# Altium footprint library lib_datalogger.PcbLib: 866 footprints (part 31 of 55)
Each footprint in its own frame and in the unit in brackets; x right, y up, seen from the top. Pads: shape width x height; smd on the part's side, far side on the other; paste and mask are expansions set on the pad; w line width, h text height; cw(c..) or ccw(c..) is an arc to the next point about the centre after c.
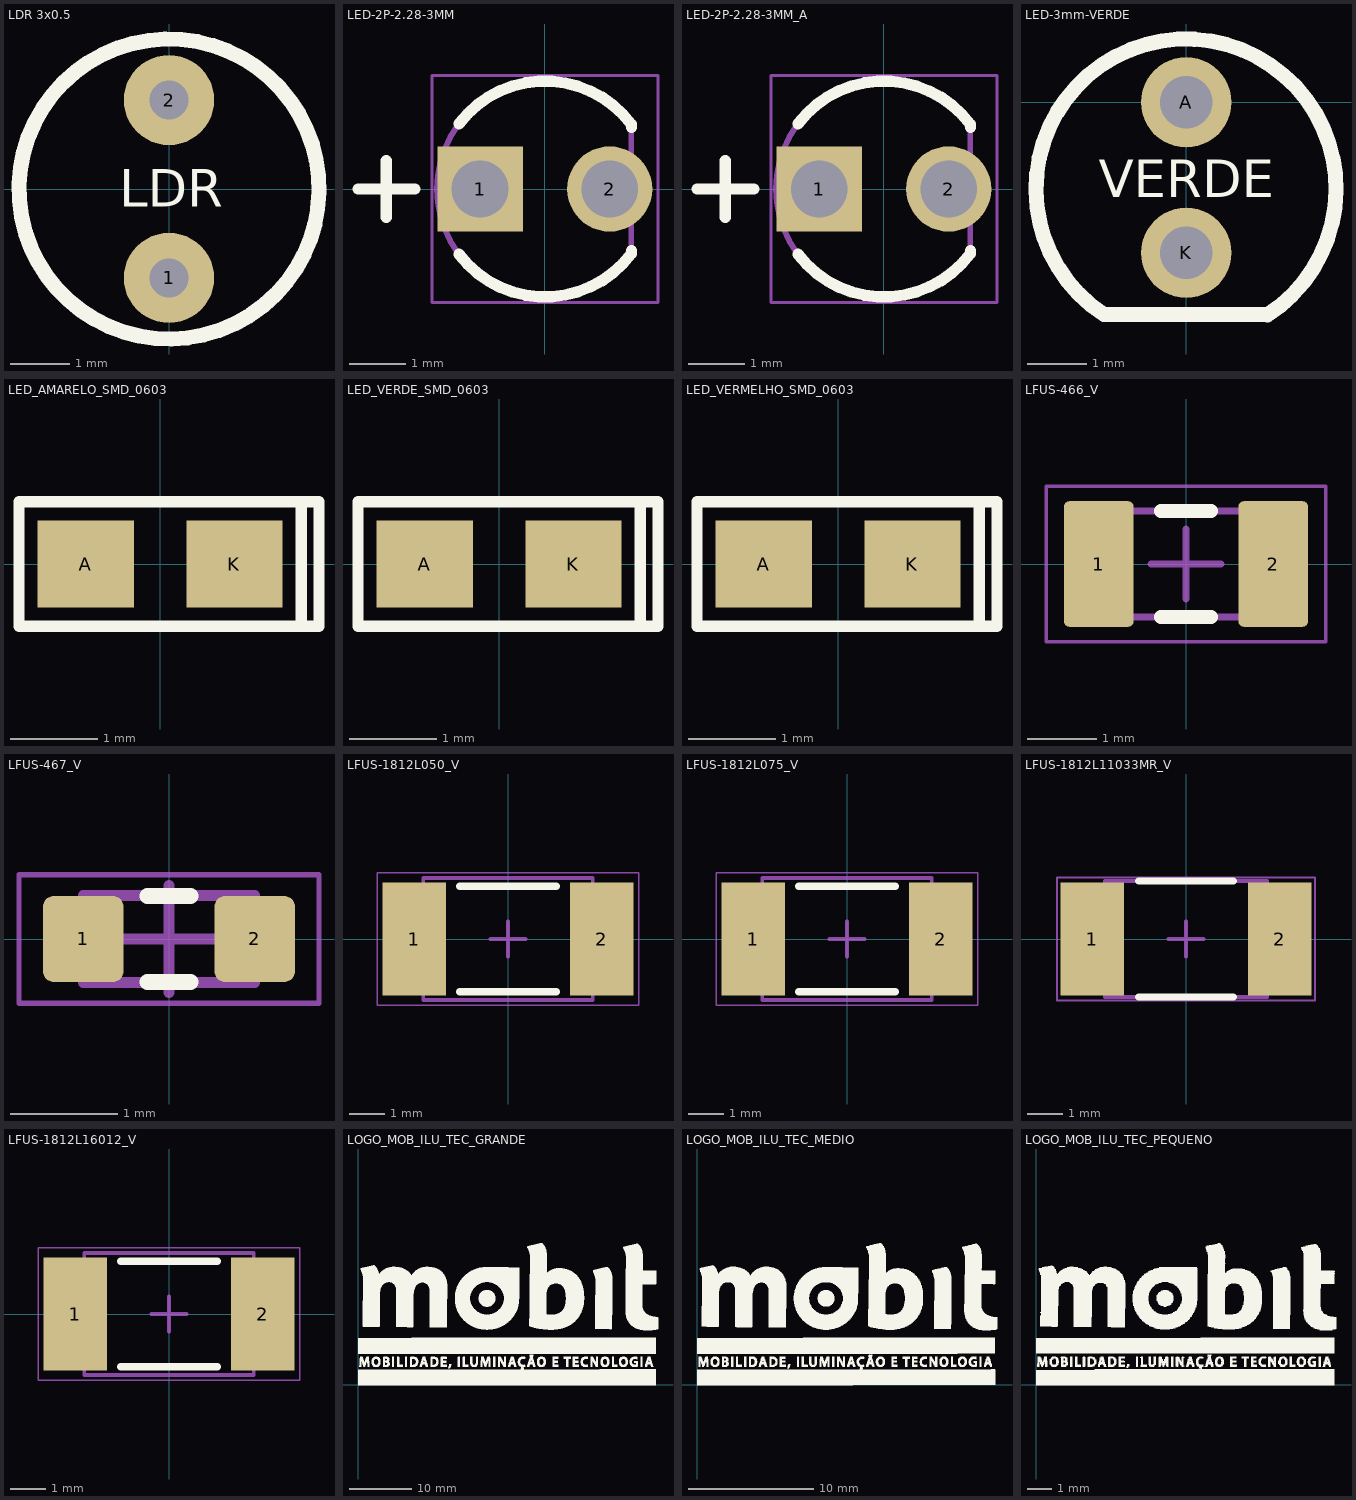
[diagram p30: the footprints below, top view; thin cyan lines are the x and y axes]

## LDR 3x0.5 [mm]
pads (2):
  round 1.524 hole 0.66: 1(0,-1.5) 2(0,1.5)
Top Overlay:
  lines w0.254: 1.337,-2.148 cw(c0,0) 1.378,-2.122
  text "LDR" at -0.84,-0.3 h0.64
3D body "LDR_photocell_v8.STEP": height 9.1, standoff -3.1, extent -2.2,-2.55 2.1,2.55

## LED-2P-2.28-3MM [mm] "LED, 2-Leads, Dia 3mm, Pitch 2.28mm"
height 5.3
pads (2):
  rect 1.5x1.5 hole 1: 1(-1.14,0)
  round 1.5 hole 1: 2(1.14,0)
Top Overlay:
  lines w0.2: -3.29,0 -2.29,0 ; -2.79,-0.5 -2.79,0.5 ; -1.512,-1.151 ccw(c0,0) 1.52,-1.14 1.524,-1.085 ; -1.512,1.151 cw(c0,0) 1.52,1.14 1.524,1.085
Mechanical 13:
  lines w0.1: 1.52,-1.14 cw(c0,0) 1.52,1.14 1.52,-1.14
Mechanical 15:
  lines w0.05: -1.99,-2 1.99,-2 1.99,2 -1.99,2 -1.99,-2
3D body: height 0, standoff -17, extent 0.89,-0.25 1.39,0.25
3D body: height 0, standoff -19, extent -1.39,-0.25 -0.89,0.25
3D body: height 1, standoff 0, extent -1.901,-1.911 1.521,1.911
3D body: height 3.8, standoff 1, extent -1.5,-1.499 1.5,1.5
3D body: height 5.3, standoff 2.3, extent -1.498,-1.5 1.5,1.5

## LED-2P-2.28-3MM_A [mm] "LED, 2-Leads, Dia 3mm, Pitch 2.28mm"
height 5.3
pads (2):
  rect 1.5x1.5 hole 1: 1(-1.14,0)
  round 1.5 hole 1: 2(1.14,0)
Top Overlay:
  lines w0.2: -3.29,0 -2.29,0 ; -2.79,-0.5 -2.79,0.5 ; -1.512,-1.151 ccw(c0,0) 1.52,-1.14 1.524,-1.085 ; -1.512,1.151 cw(c0,0) 1.52,1.14 1.524,1.085
Mechanical 13:
  lines w0.1: 1.52,-1.14 cw(c0,0) 1.52,1.14 1.52,-1.14
Mechanical 15:
  lines w0.05: -1.99,-2 1.99,-2 1.99,2 -1.99,2 -1.99,-2
3D body: height 1, standoff 0, extent -1.901,-1.911 1.521,1.911
3D body: height 3.8, standoff 1, extent -1.5,-1.499 1.5,1.5
3D body: height 5.3, standoff 2.3, extent -1.498,-1.5 1.5,1.5
3D body: height 0, standoff -5, extent -1.39,-0.25 -0.89,0.25
3D body: height 0, standoff -4, extent 0.89,-0.25 1.39,0.25

## LED-3mm-VERDE [mil]
pads (2):
  round 60 hole 35: A(0,0) K(0,-100)
Top Overlay:
  lines w10: -54.65,-140.99 cw(c-0.16,-57.59) 54.09,-141.14 ; -54,-141 53,-141
  text "VERDE" at -58.15,-63.04 h25
3D body "SW3dPS-LEDd3G.STEP": height 256.41, standoff -58.56, extent -64.57,-115.51 64.9,14.42

## LED_AMARELO_SMD_0603 [mm] "LED 0603"
height 1
pads (2):
  rect 1.1x1 smd: A(-0.85,0) K(0.85,0)
Top Overlay:
  lines w0.127: 1.614,-0.711 1.614,0.711 ; -1.612,-0.711 1.817,-0.711 1.817,0.711 -1.612,0.711 -1.612,-0.711
3D body "User Library-led0603_YEL.step": height 1.1, standoff 0, extent -0.81,-0.4 0.81,0.4

## LED_VERDE_SMD_0603 [mm] "LED 0603"
height 1
pads (2):
  rect 1.1x1 smd: A(-0.85,0) K(0.85,0)
Top Overlay:
  lines w0.127: 1.614,-0.711 1.614,0.711 ; -1.612,-0.711 -1.612,0.711 1.817,0.711 1.817,-0.711 -1.612,-0.711
3D body "User Library-led0603_GRE.step": height 1.1, standoff 0, extent -0.81,-0.4 0.81,0.4

## LED_VERMELHO_SMD_0603 [mm] "LED 0603"
height 1
pads (2):
  rect 1.1x1 smd: A(-0.85,0) K(0.85,0)
Top Overlay:
  lines w0.127: 1.614,-0.711 1.614,0.711 ; -1.612,-0.711 1.817,-0.711 1.817,0.711 -1.612,0.711 -1.612,-0.711
3D body "User Library-led0603_RED.step": height 1.1, standoff 0, extent -0.81,-0.4 0.81,0.4

## LFUS-466_V [mm] "SMD, 2-Leads, Body 3.175x1.524mm"
height 0.66
pads (2):
  rrect15% 1x1.8 smd: 1(-1.25,0) 2(1.25,0)
Top Overlay:
  lines w0.2: -0.36,-0.762 0.36,-0.762 ; -0.36,0.762 0.36,0.762
Mechanical 13:
  lines w0.1: -1.587,-0.762 1.587,-0.762 1.587,0.762 -1.587,0.762 -1.587,-0.762
Mechanical 15:
  lines w0.05: -2,-1.115 -2,1.115 2,1.115 2,-1.115 -2,-1.115
  lines w0.1: -0.5,0 0.5,0 ; 0,-0.5 0,0.5
Top Designator:
  text ".Designator" at -1.27,-0.127 h0.6
3D body: height 0.66, standoff 0, extent -1.587,-0.761 1.587,0.761

## LFUS-467_V [mm] "SMD, 2-Leads, Body 1.6x0.813mm"
height 0.432
pads (2):
  rrect25% 0.75x0.8 smd: 1(-0.8,0) 2(0.8,0)
Top Overlay:
  lines w0.15: -0.2,-0.4 0.2,-0.4 ; -0.2,0.4 0.2,0.4
Mechanical 13:
  lines w0.1: -0.8,-0.406 -0.8,0.406 0.8,0.406 0.8,-0.406 -0.8,-0.406
Mechanical 15:
  lines w0.05: -1.4,-0.6 -1.4,0.6 1.4,0.6 1.4,-0.6 -1.4,-0.6
  lines w0.1: -0.5,0 0.5,0 ; 0,-0.5 0,0.5
Top Designator:
  text ".Designator" at -1.27,-0.127 h0.6
3D body: height 0.43, standoff 0, extent 0.6,-0.406 0.8,0.406
3D body: height 0.43, standoff 0, extent -0.8,-0.406 -0.6,0.406
3D body: height 0.43, standoff 0, extent -0.6,-0.406 0.6,0.406

## LFUS-1812L050_V [mm] "Chip Fuse, 2-Leads, Body 4.73x3.41mm"
height 0.75
pads (2):
  rect 1.78x3.15 smd: 1(-2.615,0) 2(2.615,0)
Top Overlay:
  lines w0.2: -1.35,-1.475 1.35,-1.475 ; -1.35,1.475 1.35,1.475
Mechanical 13:
  lines w0.1: -2.365,-1.705 2.365,-1.705 2.365,1.705 -2.365,1.705 -2.365,-1.705
Mechanical 15:
  lines w0.05: -3.65,-1.85 3.65,-1.85 3.65,1.85 -3.65,1.85 -3.65,-1.85
  lines w0.1: -0.5,0 0.5,0 ; 0,-0.5 0,0.5
3D body "RESC4632X08L.step": height 0.75, standoff 0, extent -2.365,-1.705 2.365,1.705

## LFUS-1812L075_V [mm] "Chip Fuse, 2-Leads, Body 4.73x3.41mm"
height 0.75
pads (2):
  rect 1.78x3.15 smd: 1(-2.615,0) 2(2.615,0)
Top Overlay:
  lines w0.2: -1.35,-1.475 1.35,-1.475 ; -1.35,1.475 1.35,1.475
Mechanical 13:
  lines w0.1: -2.365,-1.705 -2.365,1.705 2.365,1.705 2.365,-1.705 -2.365,-1.705
Mechanical 15:
  lines w0.05: -3.65,-1.85 -3.65,1.85 3.65,1.85 3.65,-1.85 -3.65,-1.85
  lines w0.1: -0.5,0 0.5,0 ; 0,-0.5 0,0.5
3D body "RESC4632X08L.step": height 0.75, standoff 0, extent -2.365,-1.705 2.365,1.705

## LFUS-1812L11033MR_V [mm] "SMD, 2-Leads, Body 4.55x3.24mm"
height 2
pads (2):
  rect 1.78x3.15 smd: 1(-2.615,0) 2(2.615,0)
Top Overlay:
  lines w0.2: -1.325,-1.62 1.325,-1.62 ; -1.325,1.62 1.325,1.62
Mechanical 13:
  lines w0.1: -2.275,-1.62 -2.275,-0.4 ccw(c-2.275,0) -2.275,0.4 -2.275,1.62 2.275,1.62 2.275,0.4 ccw(c2.275,0) 2.275,-0.4 2.275,-1.62 -2.275,-1.62
Mechanical 15:
  lines w0.05: -3.605,-1.72 -3.605,1.72 3.605,1.72 3.605,-1.72 -3.605,-1.72
  lines w0.1: -0.5,0 0.5,0 ; 0,-0.5 0,0.5
3D body: height 1.99, standoff 0, extent -2.276,-1.621 2.276,1.621
3D body: height 2, standoff 0.01, extent -1.524,-1.619 1.524,1.619

## LFUS-1812L16012_V [mm] "Chip Fuse, 2-Leads, Body 4.73x3.41mm"
height 1.25
pads (2):
  rect 1.78x3.15 smd: 1(-2.615,0) 2(2.615,0)
Top Overlay:
  lines w0.2: -1.35,-1.475 1.35,-1.475 ; -1.35,1.475 1.35,1.475
Mechanical 13:
  lines w0.1: -2.365,-1.705 2.365,-1.705 2.365,1.705 -2.365,1.705 -2.365,-1.705
Mechanical 15:
  lines w0.05: -3.65,-1.85 3.65,-1.85 3.65,1.85 -3.65,1.85 -3.65,-1.85
  lines w0.1: -0.5,0 0.5,0 ; 0,-0.5 0,0.5
3D body "RESC4632X08L.step": height 0.75, standoff 0, extent -2.365,-1.705 2.365,1.705

## LOGO_MOB_ILU_TEC_GRANDE [mm]
Top Overlay:
  drawing of 6601 lines, arcs and shapes, not listed

## LOGO_MOB_ILU_TEC_MEDIO [mm]
Top Overlay:
  drawing of 3299 lines, arcs and shapes, not listed

## LOGO_MOB_ILU_TEC_PEQUENO [mm]
Top Overlay:
  drawing of 1650 lines, arcs and shapes, not listed